# Altium footprint library tianxiaohua_PcbLib.PcbLib: 138 footprints (part 7 of 9)
Each footprint in its own frame and in the unit in brackets; x right, y up, seen from the top. Pads: shape width x height; smd on the part's side, far side on the other; paste and mask are expansions set on the pad; w line width, h text height; cw(c..) or ccw(c..) is an arc to the next point about the centre after c.
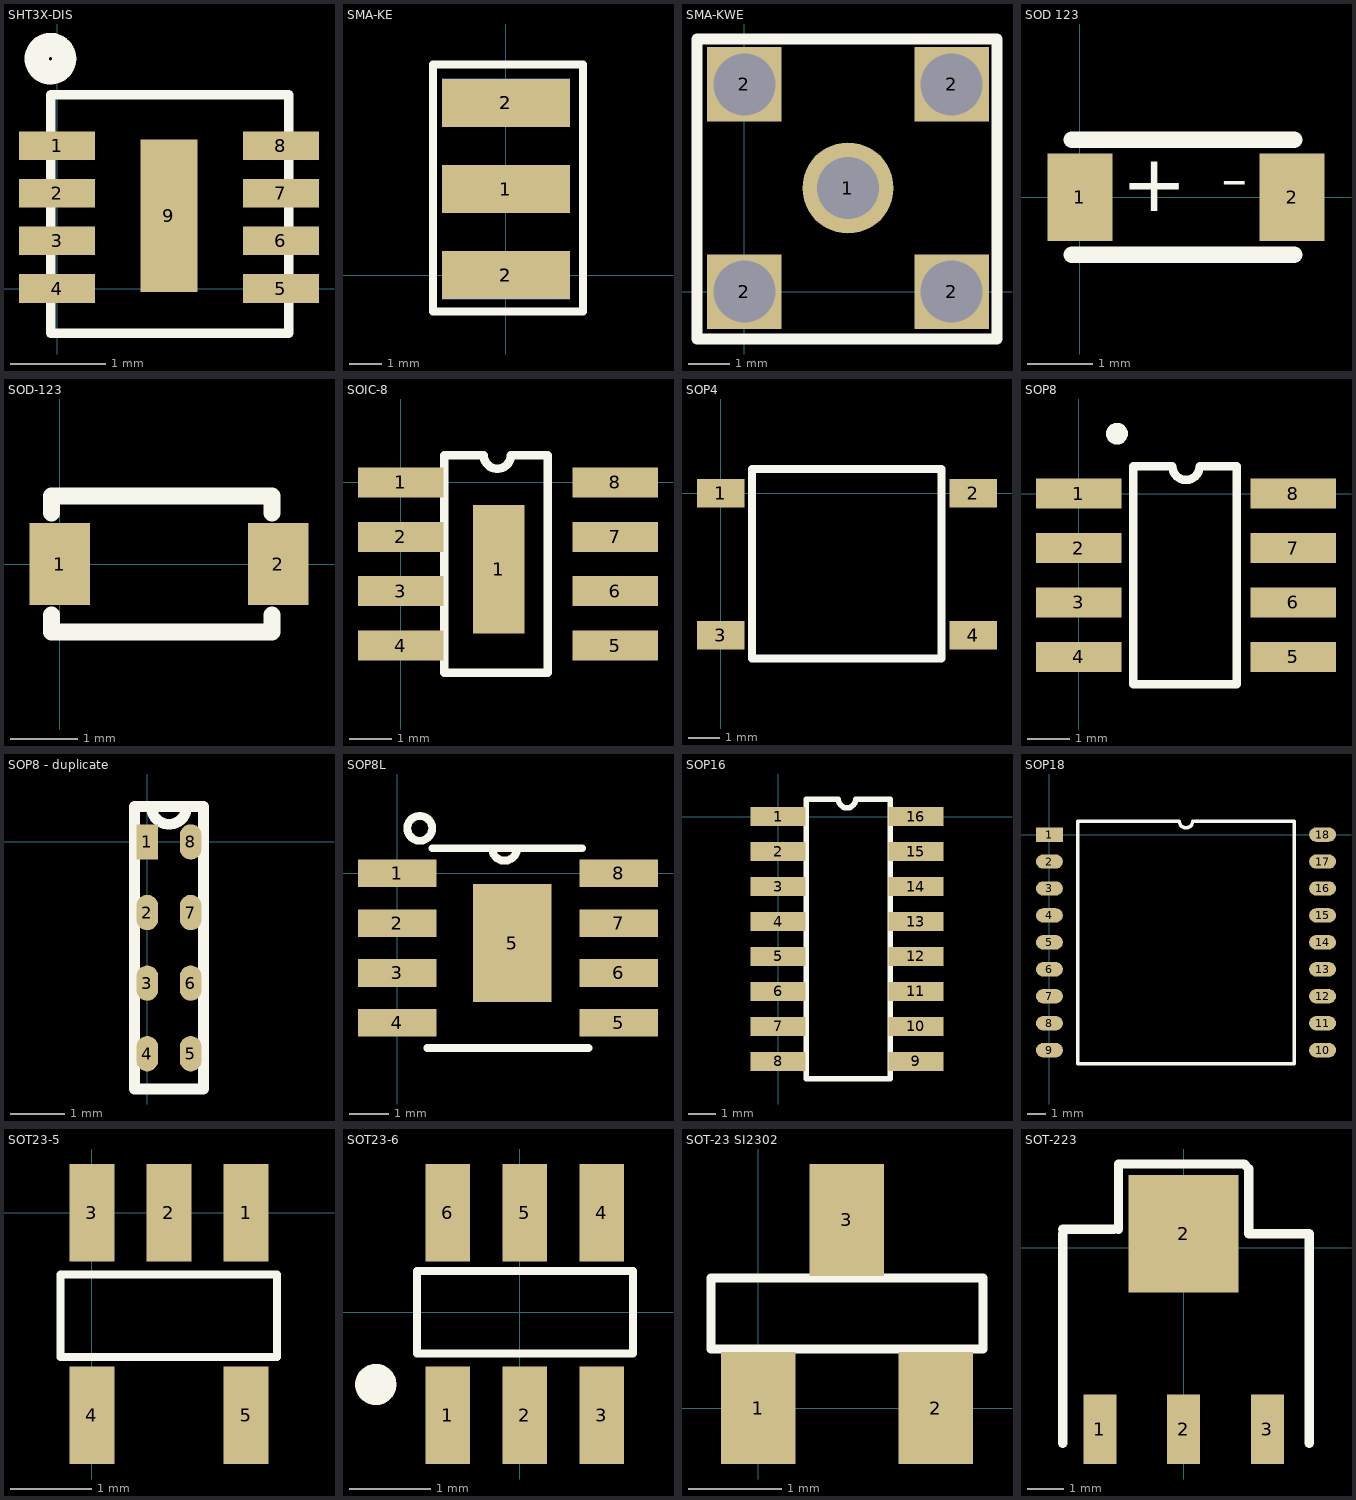
[diagram p6: the footprints below, top view; thin cyan lines are the x and y axes]

## SHT3X-DIS [mm]
pads (9):
  rect 0.8x0.3 smd: 1(0,1.5) 2(0,1) 3(0,0.5) 4(0,0) 5(2.35,0) 6(2.35,0.5) 7(2.35,1) 8(2.35,1.5)
  rect 0.6x1.6 smd: 9(1.175,0.762)
Top Overlay:
  circle w0.254: c-0.069,2.413 r0.145
  lines w0.1: -0.069,-0.468 2.431,-0.468 2.431,2.032 -0.069,2.032 -0.069,-0.468
3D body: height 0.9, standoff 0, extent -0.095,-0.508 2.445,2.032
3D body: height 1.27, standoff 0, extent 0.526,0.014 2.02,1.511

## SMA-KE [mm] "偏头天线坐"
pads (5):
  rect 4x1.5 smd: 1(0,2.7) 2(0,0) 2(0,5.4)
  rect 4x1.5 smd far side: 2(0,0) 2(0,5.4)
Top Overlay:
  lines w0.254: -2.286,-1.143 2.413,-1.143 2.413,6.604 -2.286,6.604 -2.286,-1.143
3D body "SMA-KE.step": height 3.2, standoff -2.9, extent -1.797,-0.254 11.703,5.846

## SMA-KWE [mm] "弯头天线坐"
pads (5):
  round 2.2 hole 1.5: 1(2.5,2.5)
  rect 1.8x1.8 hole 1.5: 2(0,0) 2(0,5) 2(5,0) 2(5,5)
Top Overlay:
  lines w0.254: -1.143,-1.143 6.096,-1.143 6.096,6.096 -1.143,6.096 -1.143,-1.143
3D body "SAM-KEW.step": height 9.55, standoff -3.94, extent -0.698,-0.698 14.11,5.652

## SOD 123 [mm] "适合MBR2050"
pads (2):
  rect 1x1.35 smd: 1(0,0) 2(3.27,0)
Top Overlay:
  lines w0.254: -0.127,-0.889 3.302,-0.889 ; -0.127,0.889 3.302,0.889
  text "-" at 2.159,-0.381 h1.52
  text "+" at 0.635,-0.508 h1.52
3D body "CircuitWorks-SOD123.STEP": height 1.27, standoff 0, extent -0.199,-0.8 3.501,0.8

## SOD-123 [mm]
pads (2):
  rect 0.91x1.22 smd: 1(0,0) 2(3.27,0)
Top Overlay:
  lines w0.254: -0.127,-0.762 -0.127,-1.016 3.175,-1.016 3.175,-0.762 ; -0.127,0.762 -0.127,1.016 3.175,1.016 3.175,0.762
3D body "CircuitWorks-SOD123.STEP": height 1.27, standoff 0, extent -0.326,-0.8 3.374,0.8

## SOIC-8 [mm]
pads (9):
  rect 2x0.7 smd: 1(0,0) 2(0,-1.27) 3(0,-2.54) 4(0,-3.81) 5(5,-3.81) 6(5,-2.54) 7(5,-1.27) 8(5,0)
  rect 1.2x3 smd: 1(2.286,-2.032)
Top Overlay:
  lines w0.2: 1.016,-4.445 1.016,0.635 1.933,0.635 ccw(c2.25,0.635) 2.568,0.635 3.429,0.635 3.429,-4.445 1.016,-4.445
3D body "User Library-soic-8.step": height 1.65, standoff -0.09, extent -0.508,-4.405 5.694,0.595

## SOP4 [mm]
pads (4):
  rect 1.5x0.9 smd: 1(0,0) 2(8,0) 3(0,-4.5) 4(8,-4.5)
Top Overlay:
  lines w0.254: 0.985,-5.238 0.985,0.762 6.985,0.762 6.985,-5.238 0.985,-5.238
3D body: height 3.6, standoff 0, extent 1.016,-5.207 6.985,0.762
3D body: height 8, standoff 0, extent 2.364,-3.855 5.764,-0.462

## SOP8 [mm]
pads (8):
  rect 2x0.7 smd: 1(0,0) 2(0,-1.27) 3(0,-2.54) 4(0,-3.81) 5(5,-3.81) 6(5,-2.54) 7(5,-1.27) 8(5,0)
Top Overlay:
  circle w0.254: c0.889,1.397 r0.127
  lines w0.2: 1.27,-4.445 1.27,0.635 2.183,0.635 ccw(c2.5,0.635) 2.818,0.635 3.683,0.635 3.683,-4.445 1.27,-4.445
3D body "User Library-SOIC_N-R8.STEP": height 1.75, standoff 0, extent -0.56,-4.405 5.64,0.595

## SOP8 - duplicate [mm]
pads (8):
  rect 0.4x0.65 smd: 1(0,0)
  oval 0.4x0.65 smd: 2(0,-1.3) 3(0,-2.6) 4(0,-3.9) 5(0.8,-3.9) 6(0.8,-2.6) 7(0.8,-1.3) 8(0.8,0)
Top Overlay:
  lines w0.2: -0.235,-4.55 1.035,-4.55 1.035,0.65 0.075,0.65 ccw(c0.4,0.65) 0.725,0.65 -0.235,0.65 -0.235,-4.55

## SOP8L [mm]
pads (9):
  rect 2x0.7 smd: 1(0,0) 2(0,-1.27) 3(0,-2.54) 4(0,-3.81) 5(5.635,-3.81) 6(5.635,-2.54) 7(5.635,-1.27) 8(5.635,0)
  rect 2x3 smd: 5(2.921,-1.778)
Top Overlay:
  lines w0.2: 0.889,0.635 4.699,0.635 ; 2.413,0.635 ccw(c2.73,0.635) 3.048,0.635 ; 4.699,-4.445 0.762,-4.445 4.866,-4.445 ; 0.254,1.143 cw(c0.572,1.143) 0.889,1.143 cw(c0.572,1.143) 0.254,1.143
3D body "User Library-SOIC_N-R8.STEP": height 1.75, standoff 0, extent -0.306,-4.405 5.894,0.595

## SOP16 [mm]
pads (16):
  rect 2x0.7 smd: 1(0,0) 2(0,-1.27) 3(0,-2.54) 4(0,-3.81) 5(0,-5.08) 6(0,-6.35) 7(0,-7.62) 8(0,-8.89) 9(5,-8.89) 10(5,-7.62) 11(5,-6.35) 12(5,-5.08) 13(5,-3.81) 14(5,-2.54) 15(5,-1.27) 16(5,0)
Top Overlay:
  lines w0.2: 1.016,-9.525 1.016,0.635 2.183,0.635 ccw(c2.5,0.635) 2.818,0.635 4.064,0.635 4.064,-9.525 1.016,-9.525
3D body "User Library-SOP16.STEP": height 1.59, standoff 0, extent -0.577,-9.436 5.657,0.545

## SOP18 [mm]
pads (18):
  rect 1.5x0.8 smd: 1(0,0)
  oval 1.5x0.8 smd: 2(0,-1.5) 3(0,-3) 4(0,-4.5) 5(0,-6) 6(0,-7.5) 7(0,-9) 8(0,-10.5) 9(0,-12) 10(15.2,-12) 11(15.2,-10.5) 12(15.2,-9) 13(15.2,-7.5) 14(15.2,-6) 15(15.2,-4.5) 16(15.2,-3) 17(15.2,-1.5) 18(15.2,0)
Top Overlay:
  lines w0.2: 1.585,-12.75 13.615,-12.75 13.615,0.75 7.975,0.75 cw(c7.6,0.75) 7.225,0.75 1.585,0.75 1.585,-12.75

## SOT23-5 [mm] "适用于MIC5205"
pads (5):
  rect 0.55x1.2 smd: 1(1.905,0) 2(0.955,0) 3(0.005,0) 4(0.005,-2.5) 5(1.905,-2.5)
Top Overlay:
  lines w0.1: -0.381,-1.778 -0.381,-0.762 2.286,-0.762 2.286,-1.778 -0.381,-1.778
3D body "User Library-SOT23-5-3.STEP": height 1.45, standoff 0.01, extent -0.595,-2.819 2.505,0.381

## SOT23-6 [mm]
pads (6):
  rect 0.55x1.2 smd: 1(-0.889,-1.27) 2(0.061,-1.27) 3(1.011,-1.27) 4(1.011,1.23) 5(0.061,1.23) 6(-0.889,1.23)
Top Overlay:
  circle w0.254: c-1.778,-0.889 r0.127
  lines w0.1: -1.27,-0.508 -1.27,0.508 1.397,0.508 1.397,-0.508 -1.27,-0.508
3D body "User Library-SOT23-6-2.step": height 1.45, standoff 0, extent -1.389,-1.4 1.511,1.4

## SOT-23 SI2302 [mm]
height 1
pads (3):
  rect 0.8x1.2 smd: 1(0,0) 2(1.905,0) 3(0.95,2.02)
Top Overlay:
  lines w0.1: -0.508,0.635 -0.508,1.397 2.413,1.397 2.413,0.635 -0.508,0.635
3D body "CircuitWorks-SOT-23.step": height 1.05, standoff -0.05, extent -0.611,-0.234 2.389,2.266

## SOT-223 [mm]
pads (4):
  rect 0.9x1.9 smd: 1(-2.286,-4.953) 2(0,-4.953) 3(2.286,-4.953)
  rect 3x3.2 smd: 2(0,0.381)
Top Overlay:
  lines w0.254: -3.302,-5.334 -3.302,0.381 ; -3.302,0.508 -1.905,0.508 ; -1.778,0.508 -1.778,2.286 1.651,2.286 1.778,2.159 1.778,1.651 1.778,0.381 3.175,0.381 3.429,0.381 3.429,-5.334
3D body "CircuitWorks-SOT-223.step": height 1.7, standoff 0.02, extent -3.25,-5.385 3.25,1.575